# Altium footprint library SMD Component.PcbLib: 163 footprints (part 10 of 11)
Each footprint in its own frame and in the unit in brackets; x right, y up, seen from the top. Pads: shape width x height; smd on the part's side, far side on the other; paste and mask are expansions set on the pad; w line width, h text height; cw(c..) or ccw(c..) is an arc to the next point about the centre after c.
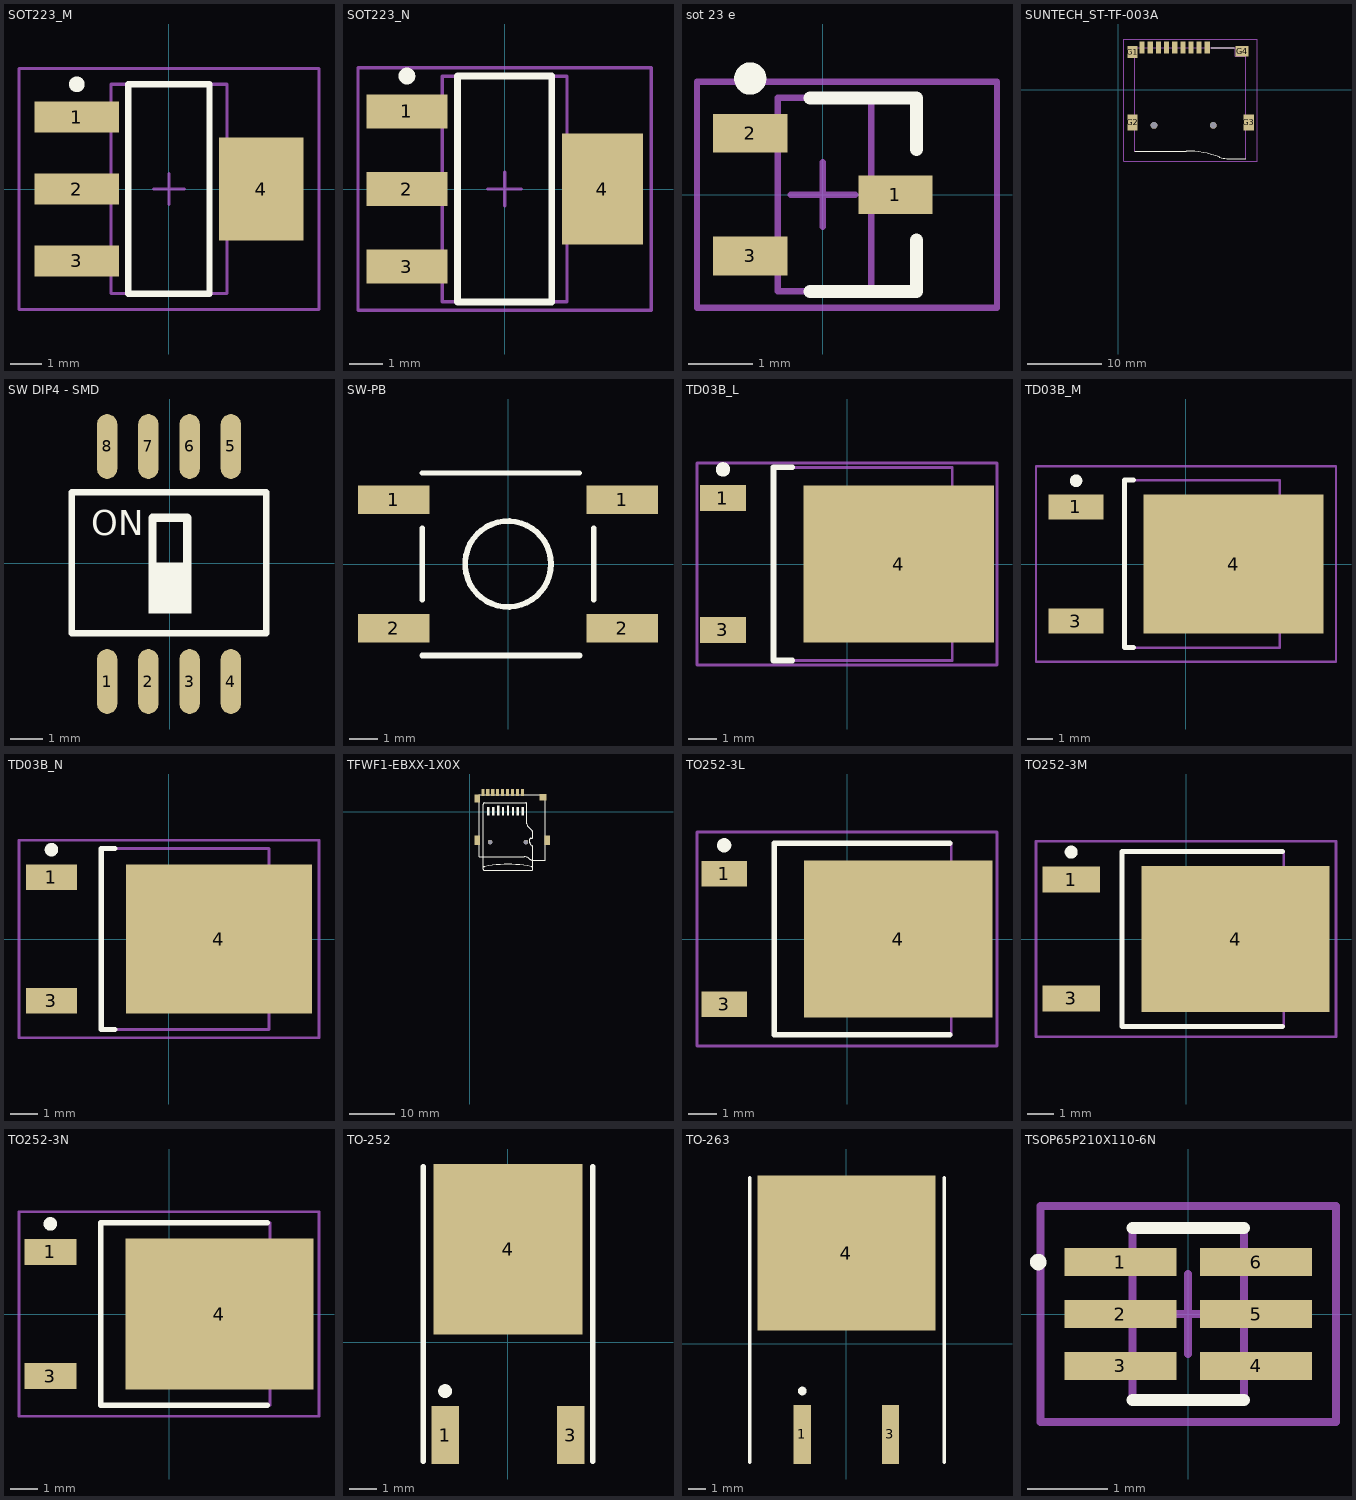
[diagram p9: the footprints below, top view; thin cyan lines are the x and y axes]

## SOT223_M [mm] "SOT223, 4-Leads, Body 6.5x3.5mm, Pitch 2.3mm, Lead Span 7mm, IPC Low Density"
height 1.8
pads (4):
  rect 2.7x1 smd: 1(-2.95,2.3) 2(-2.95,0) 3(-2.95,-2.3)
  rect 2.7x3.3 smd: 4(2.95,0)
Top Overlay:
  circle w0.25: c-2.95,3.35 r0.125
  lines w0.2: -1.3,-3.35 1.3,-3.35 1.3,3.35 -1.3,3.35 -1.3,-3.35
Mechanical 13:
  lines w0.1: -1.85,-3.35 1.85,-3.35 1.85,3.35 -1.85,3.35 -1.85,-3.35
Mechanical 15:
  lines w0.1: -0.5,0 0.5,0 ; 0,-0.5 0,0.5 ; -4.8,-3.85 4.8,-3.85 4.8,3.85 -4.8,3.85 -4.8,-3.85
3D body "TO-223.STEP": height 1.64, standoff -0.04, extent -3.49,-3.242 3.49,3.242

## SOT223_N [mm] "SOT223, 4-Leads, Body 6.5x3.5mm, Pitch 2.3mm, Lead Span 7mm, IPC Medium Density"
height 1.8
pads (4):
  rect 2.4x1 smd: 1(-2.9,2.3) 2(-2.9,0) 3(-2.9,-2.3)
  rect 2.4x3.3 smd: 4(2.9,0)
Top Overlay:
  circle w0.25: c-2.9,3.35 r0.125
  lines w0.2: -1.4,-3.35 -1.4,3.35 1.4,3.35 1.4,-3.35 -1.4,-3.35
Mechanical 13:
  lines w0.1: -1.85,-3.35 -1.85,3.35 1.85,3.35 1.85,-3.35 -1.85,-3.35
Mechanical 15:
  lines w0.1: -0.5,0 0.5,0 ; 0,-0.5 0,0.5 ; -4.35,-3.6 -4.35,3.6 4.35,3.6 4.35,-3.6 -4.35,-3.6
3D body "TO-223.STEP": height 1.64, standoff -0.04, extent -3.49,-3.242 3.49,3.242

## sot 23 e [mm]
pads (3):
  rect 1.15x0.6 smd: 1(1.125,0) 2(-1.125,0.95) 3(-1.125,-0.95)
Top Overlay:
  circle w0.25: c-1.125,1.8 r0.125
  lines w0.2: -0.2,-1.5 1.45,-1.5 1.45,-0.7 ; -0.2,1.5 1.45,1.5 1.45,0.7
Mechanical 13:
  lines w0.1: -0.7,-1.5 -0.7,1.5 0.75,1.5 0.75,-1.5 -0.7,-1.5
Mechanical 15:
  lines w0.1: -0.5,0 0.5,0 ; 0,-0.5 0,0.5 ; -1.95,-1.75 -1.95,1.75 2.7,1.75 2.7,-1.75 -1.95,-1.75
3D body: height 1.14, standoff 0, extent -0.7,-1.5 0.7,1.5

## SUNTECH_ST-TF-003A [mm]
pads (15):
  rect 0.7x1.6 smd: 1(12.029,5.711) 2(10.929,5.711) 3(9.829,5.711) 4(8.729,5.711) 5(7.629,5.711) 6(6.529,5.711) 7(5.429,5.711) 8(4.329,5.711) 9(3.229,5.711)
  rect 1.4x1.6 smd: G1(1.929,5.111)
  rect 1.4x2.2 smd: G2(1.929,-4.389) G3(17.629,-4.389)
  rect 1.8x1.4 smd: G4(16.729,5.211)
  round 0.9 hole 0.9 unplated: ""(4.829,-4.789) ""(12.829,-4.789)
Top Overlay:
  lines w0.127: 2.222,-8.259 9.156,-8.259 cw(c9.156,-20.959) 13.707,-9.103 ; 12.579,5.711 15.679,5.711 ; 13.67,-9.088 ccw(c14.677,-6.466) 14.677,-9.275 17.208,-9.275
Mechanical 13:
  lines w0.127: 2.222,-8.259 2.222,5.711 15.811,5.711 15.811,4.568 17.208,4.568 17.208,-9.275
Mechanical 15:
  lines w0.127: 0.759,-9.619 18.759,-9.619 18.759,6.881 0.759,6.881 0.759,-9.619
3D body "ST-TF-003A--3DModel-STEP-56544.STEP": height 1.9, standoff -0.55, extent 1.729,-8.777 17.829,6.223

## SW DIP4 - SMD [mm]
pads (8):
  oval 0.625x2 smd: 1(-1.93,-3.641) 2(-0.66,-3.641) 3(0.61,-3.641) 4(1.88,-3.641) 5(1.88,3.591) 6(0.61,3.591) 7(-0.66,3.591) 8(-1.93,3.591)
Top Overlay:
  rectangle: -0.66,-1.549 0.66,0.025
  lines w0.2: -3.023,-2.159 2.972,-2.159 2.972,2.184 -3.023,2.184 -3.023,-2.159
  lines w0.254: -0.533,0.025 -0.533,1.397 0.533,1.397 0.533,0.025
  text "ON" at -2.413,0.864 h0.76
3D body "User Library-TDA04.STEP": height 2.35, standoff 0, extent -3.106,-4.066 3.104,4.067

## SW-PB [mm]
pads (4):
  rect 2.5x1 smd: 1(-3.992,2.25) 1(3.992,2.25) 2(-3.992,-2.25) 2(3.992,-2.25)
Top Overlay:
  circle w0.2: c0,0 r1.5
  lines w0.178: -2.997,3.175 2.503,3.175
  lines w0.2: -3,-1.25 -3,1.25 ; -2.997,-3.2 2.503,-3.2 ; 3,-1.25 3,1.25
3D body "SW3dPS-switch.STEP": height 5, standoff 0, extent -4.5,-3 4.5,3

## TD03B_L [mm] "D-PAK, 4-Leads, Body 6.1x6.6mm, Pitch 2.29mm, Lead Span 9.7mm, IPC High Density"
height 2.38
pads (3):
  rect 1.6x0.9 smd: 1(-4.3,2.28) 3(-4.3,-2.28)
  rect 6.6x5.45 smd: 4(1.8,0)
Top Overlay:
  circle w0.25: c-4.3,3.28 r0.125
  lines w0.2: -1.9,-3.35 -2.55,-3.35 -2.55,3.35 -1.9,3.35
Mechanical 13:
  lines w0.1: -2.55,-3.35 3.65,-3.35 3.65,3.35 -2.55,3.35 -2.55,-3.35
Mechanical 15:
  lines w0.1: -0.5,0 0.5,0 ; 0,-0.5 0,0.5 ; -5.2,-3.5 5.2,-3.5 5.2,3.5 -5.2,3.5 -5.2,-3.5
3D body "DPAK.STEP": height 2.34, standoff -0.07, extent -5.176,-3.27 4.762,3.27

## TD03B_M [mm] "D-PAK, 4-Leads, Body 6.1x6.6mm, Pitch 2.29mm, Lead Span 9.7mm, IPC Low Density"
height 2.38
pads (3):
  rect 2.2x1 smd: 1(-4.4,2.28) 3(-4.4,-2.28)
  rect 7.2x5.55 smd: 4(1.9,0)
Top Overlay:
  circle w0.25: c-4.4,3.33 r0.125
  lines w0.2: -2.1,-3.35 -2.45,-3.35 -2.45,3.35 -2.1,3.35
Mechanical 13:
  lines w0.1: -2.45,-3.35 -2.45,3.35 3.75,3.35 3.75,-3.35 -2.45,-3.35
Mechanical 15:
  lines w0.1: -0.5,0 0.5,0 ; 0,-0.5 0,0.5 ; -6,-3.9 -6,3.9 6,3.9 6,-3.9 -6,-3.9
3D body "DPAK.STEP": height 2.34, standoff -0.07, extent -5.176,-3.27 4.762,3.27

## TD03B_N [mm] "D-PAK, 4-Leads, Body 6.1x6.6mm, Pitch 2.29mm, Lead Span 9.7mm, IPC Medium Density"
height 2.38
pads (3):
  rect 1.9x0.95 smd: 1(-4.35,2.28) 3(-4.35,-2.28)
  rect 6.9x5.5 smd: 4(1.85,0)
Top Overlay:
  circle w0.25: c-4.35,3.305 r0.125
  lines w0.2: -2,-3.35 -2.5,-3.35 -2.5,3.35 -2,3.35
Mechanical 13:
  lines w0.1: -2.5,-3.35 3.7,-3.35 3.7,3.35 -2.5,3.35 -2.5,-3.35
Mechanical 15:
  lines w0.1: -0.5,0 0.5,0 ; 0,-0.5 0,0.5 ; -5.55,-3.65 5.55,-3.65 5.55,3.65 -5.55,3.65 -5.55,-3.65
3D body "DPAK.STEP": height 2.34, standoff -0.07, extent -5.176,-3.27 4.762,3.27

## TFWF1-EBXX-1X0X [mm]
pads (15):
  round 1 hole 1 unplated: 0(4.495,-6.74) 0(12.495,-6.74)
  rect 0.7x1.6 smd: 1(11.695,4.26) 2(10.595,4.26) 3(9.495,4.26) 4(8.395,4.26) 5(7.295,4.26) 6(6.195,4.26) 7(5.095,4.26) 8(3.995,4.26) 9(2.895,4.26)
  rect 1.2x1.8 smd: 10(1.695,2.96)
  rect 1.2x2.2 smd: 11(1.695,-6.34) 12(17.195,-6.34)
  rect 1.6x1.5 smd: 13(16.295,3.21)
Top Overlay:
  rectangle: 3.841,-0.84 4.349,1.014
  rectangle: 4.941,-0.84 5.449,1.014
  rectangle: 6.041,-0.84 6.549,1.395
  rectangle: 7.141,-0.84 7.649,1.014
  rectangle: 8.241,-0.84 8.749,1.395
  rectangle: 9.341,-0.84 9.849,1.014
  rectangle: 10.441,-0.84 10.949,1.014
  rectangle: 11.541,-0.84 12.049,1.014
  lines w0.2: 3.008,-12.393 cw(c3.418,-12.804) 3.297,-12.236 cw(c8.495,-36.69) 13.693,-12.236 cw(c13.572,-12.804) 13.982,-12.393 ; 13.295,-6.862 13.295,-6.144 cw(c13.549,-6.144) 13.549,-5.89 13.741,-5.89 ccw(c13.741,-5.636) 13.995,-5.636 13.995,-4.6 ccw(c13.487,-4.6) 13.846,-4.241 12.995,-3.39 cw(c13.719,-2.666) 12.695,-2.666 12.695,1.706 ccw(c12.441,1.706) 12.441,1.96 3.249,1.96 ccw(c3.249,1.706) 2.995,1.706 2.995,-12.786 ccw(c3.249,-12.786) 3.249,-13.04 13.741,-13.04 ccw(c13.741,-12.786) 13.995,-12.786 13.995,-7.95 ccw(c13.487,-7.95) 13.846,-7.591 13.444,-7.189 cw(c13.803,-6.83) 13.295,-6.83
  lines w0.254: 2.07,-10.04 2.07,3.76 16.82,3.76 16.82,-10.74 13.82,-10.74 cw(c13.82,-10.124) 13.385,-10.56 ccw(c12.13,-11.814) 12.13,-10.04 2.07,-10.04
3D body "SW3dPS-Micro_SD.STEP": height 1.7, standoff 0.72, extent 3.056,-13.051 14.056,1.949
3D body "User Library-MEM2055-00-190-01-A_revG.STEP": height 1.85, standoff -0.6, extent 1.444,-10.77 17.444,4.48

## TO252-3L [mm] "D-PAK, 3-Pads, Body 6.2x6.7mm (max), IPC High Density"
height 2.38
pads (3):
  rect 1.6x0.9 smd: 1(-4.3,2.28) 3(-4.3,-2.28)
  rect 6.6x5.5 smd: 4(1.8,0)
Top Overlay:
  circle w0.25: c-4.3,3.28 r0.125
  lines w0.2: 3.6,-3.35 -2.55,-3.35 -2.55,3.35 3.6,3.35
Mechanical 13:
  lines w0.1: -2.55,-3.35 -2.55,3.35 3.65,3.35 3.65,-3.35 -2.55,-3.35
Mechanical 15:
  lines w0.1: -0.5,0 0.5,0 ; 0,-0.5 0,0.5 ; -5.25,-3.75 -5.25,3.75 5.25,3.75 5.25,-3.75 -5.25,-3.75
3D body "User Library-DPAK-1.step": height 2.39, standoff -0.02, extent -5.061,-3.27 4.878,3.27

## TO252-3M [mm] "D-PAK, 3-Pads, Body 6.2x6.7mm (max), IPC Low Density"
height 2.38
pads (3):
  rect 2.2x1 smd: 1(-4.4,2.28) 3(-4.4,-2.28)
  rect 7.2x5.6 smd: 4(1.9,0)
Top Overlay:
  circle w0.25: c-4.4,3.33 r0.125
  lines w0.2: 3.7,-3.35 -2.45,-3.35 -2.45,3.35 3.7,3.35
Mechanical 13:
  lines w0.1: -2.45,-3.35 3.75,-3.35 3.75,3.35 -2.45,3.35 -2.45,-3.35
Mechanical 15:
  lines w0.1: -0.5,0 0.5,0 ; 0,-0.5 0,0.5 ; -5.75,-3.75 -5.75,3.75 5.75,3.75 5.75,-3.75 -5.75,-3.75
3D body "User Library-DPAK-1.step": height 2.39, standoff -0.02, extent -5.061,-3.27 4.878,3.27

## TO252-3N [mm] "D-PAK, 3-Pads, Body 6.2x6.7mm (max), IPC Medium Density"
height 2.38
pads (3):
  rect 1.9x0.95 smd: 1(-4.35,2.28) 3(-4.35,-2.28)
  rect 6.9x5.55 smd: 4(1.85,0)
Top Overlay:
  circle w0.25: c-4.35,3.305 r0.125
  lines w0.2: 3.6,-3.35 -2.5,-3.35 -2.5,3.35 3.6,3.35
Mechanical 13:
  lines w0.1: -2.5,-3.35 -2.5,3.35 3.7,3.35 3.7,-3.35 -2.5,-3.35
Mechanical 15:
  lines w0.1: -0.5,0 0.5,0 ; 0,-0.5 0,0.5 ; -5.5,-3.75 -5.5,3.75 5.5,3.75 5.5,-3.75 -5.5,-3.75
3D body "User Library-DPAK-1.step": height 2.39, standoff -0.02, extent -5.061,-3.27 4.878,3.27

## TO-252 [mm] "D-PAK/TO-252-AA; 3 Leads (1 Cropped); Body 10.1 (inc. leads) x 6.6 mm (LxW max)"
pads (3):
  rect 1x2.1 smd: 1(-2.285,-3.375) 3(2.285,-3.375)
  rect 5.4x6.2 smd: 4(0,3.375)
Top Overlay:
  circle w0.25: c-2.285,-1.775 r0.125
  lines w0.2: -3.085,-4.325 -3.085,6.375 ; 3.085,-4.325 3.085,6.375
3D body "User Library-DPAK-1.step": height 2.39, standoff -0.02, extent -3.27,-4.111 3.27,5.827

## TO-263 [mm] "L7800CD2T _ D2-PAK/TO-263-AB; 3 Leads (1 Cropped); Body 15.9 (inc. leads) x 10.4 mm (LxW max)"
height 4.6
pads (3):
  rect 1x3.4 smd: 1(-2.54,-5.225) 3(2.54,-5.225)
  rect 10.25x8.9 smd: 4(0,5.225)
Top Overlay:
  circle w0.25: c-2.54,-2.721 r0.125
  lines w0.2: -5.563,-6.833 -5.563,9.567 ; 5.639,-6.833 5.639,9.567
3D body "DPAK-TO-263.STEP": height 4.88, standoff -0.13, extent -5.08,-6.108 5.08,9.156

## TSOP65P210X110-6N [mm] "TSOP, 6-Leads, Body 2.2x1.4mm (max), Pitch 0.65mm, IPC Medium Density"
height 1.1
pads (6):
  rect 1.4x0.35 smd: 1(-0.85,0.65) 2(-0.85,0) 3(-0.85,-0.65) 4(0.85,-0.65) 5(0.85,0) 6(0.85,0.65)
Top Overlay:
  circle w0.15: c-1.878,0.65 r0.028
  lines w0.15: -0.7,-1.075 0.7,-1.075 ; -0.7,1.075 0.7,1.075
Mechanical 13:
  lines w0.1: -0.7,-1.075 0.7,-1.075 0.7,1.075 -0.7,1.075 -0.7,-1.075
Mechanical 15:
  lines w0.1: -0.5,0 0.5,0 ; 0,-0.5 0,0.5 ; -1.85,-1.35 1.85,-1.35 1.85,1.35 -1.85,1.35 -1.85,-1.35
3D body: height 1.1, standoff 0, extent 0,0 0,0